# Altium footprint library ICL_passives_v1.PcbLib: 102 footprints (part 1 of 7)
Each footprint in its own frame and in the unit in brackets; x right, y up, seen from the top. Pads: shape width x height; smd on the part's side, far side on the other; paste and mask are expansions set on the pad; w line width, h text height; cw(c..) or ccw(c..) is an arc to the next point about the centre after c.
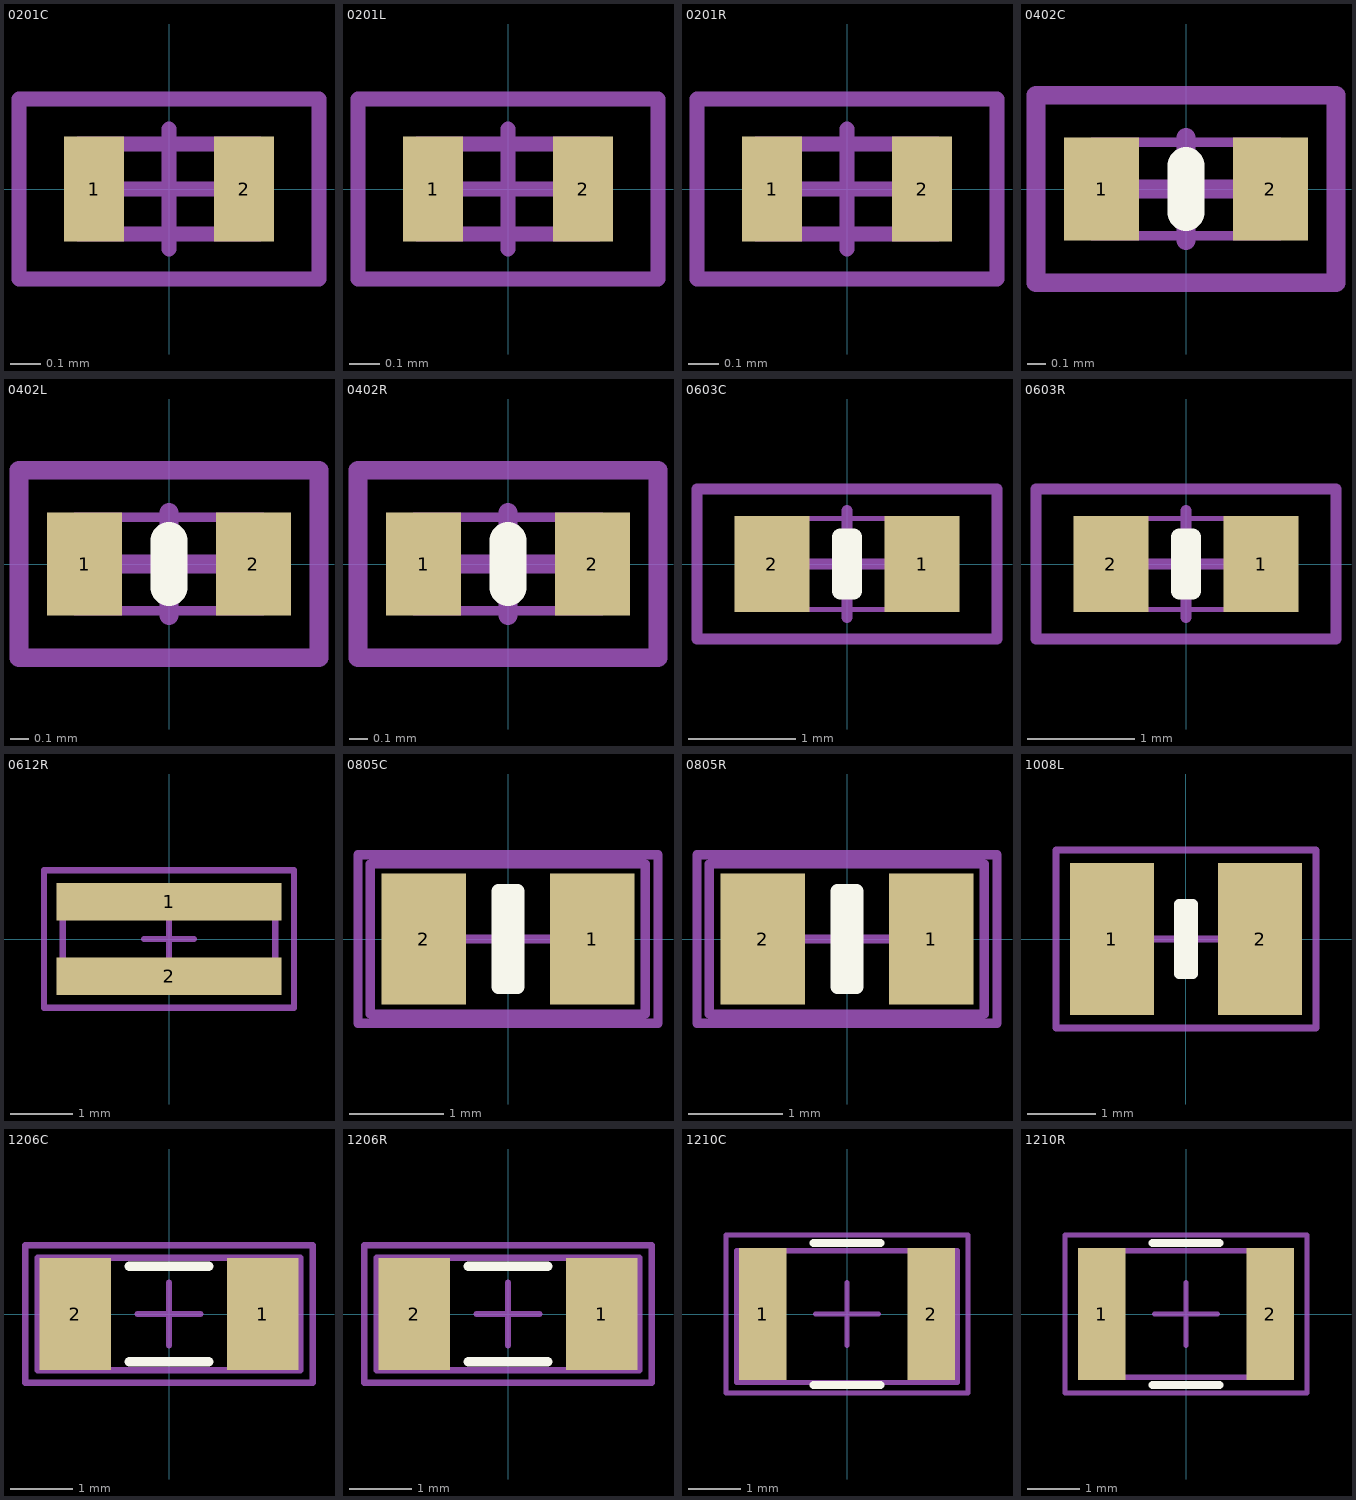
[diagram p0: the footprints below, top view; thin cyan lines are the x and y axes]

## 0201C [mm]
height 0.37
pads (2):
  rect 0.2x0.35 smd mask+0.05: 1(-0.25,0) 2(0.25,0)
Top M11-12_SMOT:
  rectangle: -0.3,-0.15 -0.2,0.15
  rectangle: 0.2,-0.15 0.3,0.15
  lines w0.05: -0.3,-0.15 0.3,-0.15 0.3,0.15 -0.3,0.15 -0.3,-0.15
Top M13-14_SDES:
  text "'.Designator'" at -1.699,-0.125 h0.3
Top M15-16_SORG:
  lines w0.05: -0.275,0 0.275,0 ; 0,-0.2 0,0.2 ; -0.5,-0.3 0.5,-0.3 0.5,0.3 -0.5,0.3 -0.5,-0.3
3D body "0201(0603M) Cap.step": height 0.32, standoff 0.01, extent -0.305,-0.152 0.305,0.152

## 0201L [mm]
height 0.37
pads (2):
  rect 0.2x0.35 smd mask+0.05: 1(-0.25,0) 2(0.25,0)
Top M11-12_SMOT:
  rectangle: -0.3,-0.15 -0.2,0.15
  rectangle: 0.2,-0.15 0.3,0.15
  lines w0.05: -0.3,-0.15 0.3,-0.15 0.3,0.15 -0.3,0.15 -0.3,-0.15
Top M13-14_SDES:
  text "'.Designator'" at -1.699,-0.125 h0.3
Top M15-16_SORG:
  lines w0.05: -0.275,0 0.275,0 ; 0,-0.2 0,0.2 ; -0.5,-0.3 -0.5,0.3 0.5,0.3 0.5,-0.3 -0.5,-0.3
3D body "0201(0603M) Res.step": height 0.32, standoff 0.01, extent -0.305,-0.152 0.305,0.152

## 0201R [mm]
height 0.37
pads (2):
  rect 0.2x0.35 smd mask+0.05: 1(-0.25,0) 2(0.25,0)
Top M11-12_SMOT:
  rectangle: 0.2,-0.15 0.3,0.15
  rectangle: -0.3,-0.15 -0.2,0.15
  lines w0.05: -0.3,-0.15 -0.3,0.15 0.3,0.15 0.3,-0.15 -0.3,-0.15
Top M13-14_SDES:
  text "'.Designator'" at -1.699,-0.125 h0.3
Top M15-16_SORG:
  lines w0.05: -0.275,0 0.275,0 ; 0,-0.2 0,0.2 ; -0.5,-0.3 0.5,-0.3 0.5,0.3 -0.5,0.3 -0.5,-0.3
3D body "0201(0603M) Res.step": height 0.32, standoff 0.01, extent -0.305,-0.152 0.305,0.152

## 0402C [mm]
height 0.37
pads (2):
  rect 0.4x0.55 smd: 1(-0.45,0) 2(0.45,0)
Top Overlay:
  lines w0.2: 0,-0.125 0,0.125
Top M11-12_SMOT:
  rectangle: 0.4,-0.25 0.5,0.25
  rectangle: -0.5,-0.25 -0.4,0.25
  lines w0.05: -0.5,-0.25 0.5,-0.25 0.5,0.25 -0.5,0.25 -0.5,-0.25
Top M13-14_SDES:
  text "'.Designator'" at -2.266,-0.167 h0.4
Top M15-16_SORG:
  lines w0.1: -0.275,0 0.275,0 ; 0,-0.275 0,0.275 ; -0.8,-0.5 -0.8,0.5 0.8,0.5 0.8,-0.5 -0.8,-0.5
3D body "0402(1005M)_C.step": height 0.52, standoff 0.01, extent -0.514,-0.254 0.502,0.254

## 0402L [mm]
height 0.37
pads (2):
  rect 0.4x0.55 smd: 1(-0.45,0) 2(0.45,0)
Top Overlay:
  lines w0.2: 0,-0.125 0,0.125
Top M11-12_SMOT:
  rectangle: -0.5,-0.25 -0.4,0.25
  rectangle: 0.4,-0.25 0.5,0.25
  lines w0.05: -0.5,-0.25 -0.5,0.25 0.5,0.25 0.5,-0.25 -0.5,-0.25
Top M13-14_SDES:
  text "'.Designator'" at -2.266,-0.167 h0.4
Top M15-16_SORG:
  lines w0.1: -0.275,0 0.275,0 ; 0,-0.275 0,0.275 ; -0.8,-0.5 0.8,-0.5 0.8,0.5 -0.8,0.5 -0.8,-0.5
3D body "0402(1005M)R.step": height 0.52, standoff 0.01, extent -0.514,-0.254 0.502,0.254

## 0402R [mm]
height 0.37
pads (2):
  rect 0.4x0.55 smd: 1(-0.45,0) 2(0.45,0)
Top Overlay:
  lines w0.2: 0,-0.125 0,0.125
Top M11-12_SMOT:
  rectangle: -0.5,-0.25 -0.4,0.25
  rectangle: 0.4,-0.25 0.5,0.25
  lines w0.05: -0.5,-0.25 -0.5,0.25 0.5,0.25 0.5,-0.25 -0.5,-0.25
Top M13-14_SDES:
  text "'.Designator'" at -2.266,-0.167 h0.4
Top M15-16_SORG:
  lines w0.1: -0.275,0 0.275,0 ; 0,-0.275 0,0.275 ; -0.8,-0.5 -0.8,0.5 0.8,0.5 0.8,-0.5 -0.8,-0.5
3D body "0402(1005M)R.step": height 0.52, standoff 0.01, extent -0.514,-0.254 0.502,0.254

## 0603C [mm]
height 0.381
pads (2):
  rect 0.7x0.9 smd: 1(0.7,0) 2(-0.7,0)
Top Overlay:
  lines w0.152: -0.064,-0.254 0.064,-0.254 0.064,0.254 -0.064,0.254 -0.064,-0.254
Top M11-12_SMOT:
  rectangle: 0.6,-0.425 0.775,0.425
  rectangle: -0.775,-0.425 -0.6,0.425
  lines w0.05: -0.775,-0.425 0.775,-0.425 0.775,0.425 -0.775,0.425 -0.775,-0.425
Top M13-14_SDES:
  text "'.Designator'" at -3.399,-0.25 h0.6
Top M15-16_SORG:
  lines w0.1: -0.5,0 0.5,0 ; 0,-0.5 0,0.5 ; -1.4,-0.7 -1.4,0.7 1.4,0.7 1.4,-0.7 -1.4,-0.7
3D body "0603(1608M) Cap.step": height 0.79, standoff 0, extent -1,-0.394 1,0.394

## 0603R [mm]
height 0.381
pads (2):
  rect 0.7x0.9 smd: 1(0.7,0) 2(-0.7,0)
Top Overlay:
  lines w0.152: -0.064,-0.254 0.064,-0.254 0.064,0.254 -0.064,0.254 -0.064,-0.254
Top M11-12_SMOT:
  rectangle: 0.6,-0.425 0.775,0.425
  rectangle: -0.775,-0.425 -0.6,0.425
  lines w0.05: -0.775,-0.425 0.775,-0.425 0.775,0.425 -0.775,0.425 -0.775,-0.425
Top M13-14_SDES:
  text "'.Designator'" at -3.399,-0.25 h0.6
Top M15-16_SORG:
  lines w0.1: -0.5,0 0.5,0 ; 0,-0.5 0,0.5 ; -1.4,-0.7 -1.4,0.7 1.4,0.7 1.4,-0.7 -1.4,-0.7
3D body "User Library-0603(1608M) Res.step": height 0.8, standoff 0.01, extent -1,-0.394 1,0.394

## 0612R [mm]
pads (2):
  rect 3.6x0.6 smd: 1(0,0.6) 2(0,-0.6)
Top M11-12_SMOT:
  rectangle: -1.7,0.3 1.7,0.8
  rectangle: -1.7,-0.8 1.7,-0.3
  lines w0.1: -1.7,-0.8 1.7,-0.8 1.7,0.8 -1.7,0.8 -1.7,-0.8
Top M13-14_SDES:
  text "'.Designator'" at -3.399,-0.25 h0.6
Top M15-16_SORG:
  lines w0.1: -0.4,0 0.4,0 ; 0,-0.4 0,0.4 ; -2,-1.1 -2,1.1 2,1.1 2,-1.1 -2,-1.1
3D body "R0612__ERJB2.step": height 0.66, standoff 0.01, extent -1.6,-0.8 1.6,0.8

## 0805C [mm]
pads (2):
  rect 0.9x1.4 smd: 1(0.9,0) 2(-0.9,0)
Top Overlay:
  rectangle: -0.127,-0.508 0.127,0.508
  lines w0.152: -0.102,-0.508 -0.102,0.508 0.102,0.508 0.102,-0.508 -0.102,-0.508
Top M11-12_SMOT:
  lines w0.1: -1.468,-0.8 1.465,-0.8 1.465,0.8 -1.468,0.8 -1.468,-0.8
Top M13-14_SDES:
  text "'.Designator'" at -3.418,-0.218 h0.6
Top M15-16_SORG:
  lines w0.1: -0.5,0 0.5,0 ; 0,-0.5 0,0.5 ; -1.6,-0.9 -1.6,0.9 1.6,0.9 1.6,-0.9 -1.6,-0.9
3D body "SMD_0805_Capacitor.step": height 0.79, standoff 0.01, extent -1,-0.625 1,0.625

## 0805R [mm]
pads (2):
  rect 0.9x1.4 smd: 1(0.9,0) 2(-0.9,0)
Top Overlay:
  rectangle: -0.127,-0.508 0.127,0.508
  lines w0.152: -0.102,-0.508 0.102,-0.508 0.102,0.508 -0.102,0.508 -0.102,-0.508
Top M11-12_SMOT:
  lines w0.1: -1.468,-0.8 -1.468,0.8 1.465,0.8 1.465,-0.8 -1.468,-0.8
Top M13-14_SDES:
  text "'.Designator'" at -3.418,-0.25 h0.6
Top M15-16_SORG:
  lines w0.1: -0.5,0 0.5,0 ; 0,-0.5 0,0.5 ; -1.6,-0.9 1.6,-0.9 1.6,0.9 -1.6,0.9 -1.6,-0.9
3D body "User Library-0805(2012M) Res.step": height 0.8, standoff 0.01, extent -1.254,-0.622 1.254,0.622

## 1008L [mm]
pads (2):
  rect 1.23x2.22 smd: 1(-1.085,0) 2(1.085,0)
Top Overlay:
  rectangle: -0.127,-0.508 0.127,0.508
  lines w0.152: -0.102,-0.508 -0.102,0.508 0.102,0.508 0.102,-0.508 -0.102,-0.508
Top M11-12_SMOT:
  lines w0.1: -1.9,-1.3 1.9,-1.3 1.9,1.3 -1.9,1.3 -1.9,-1.3
Top M13-14_SDES:
  text "'.Designator'" at -3.418,-0.25 h0.6
Top M15-16_SORG:
  lines w0.1: -0.5,0 0.5,0 ; 0,-0.5 0,0.5 ; -1.9,-1.3 -1.9,1.3 1.9,1.3 1.9,-1.3 -1.9,-1.3
3D body "1008L.step": height 1.2, standoff 0, extent -1.35,-1.1 1.35,1.1

## 1206C [mm]
pads (2):
  rect 1.15x1.8 smd: 1(1.5,0) 2(-1.5,0)
Top Overlay:
  lines w0.152: -0.635,-0.762 0.635,-0.762 ; -0.635,0.762 0.635,0.762
Top M11-12_SMOT:
  lines w0.1: -2.1,-0.9 2.1,-0.9 2.1,0.9 -2.1,0.9 -2.1,-0.9
Top M13-14_SDES:
  text "'.Designator'" at -3.418,-0.25 h0.6
Top M15-16_SORG:
  lines w0.1: -0.5,0 0.5,0 ; 0,-0.5 0,0.5 ; -2.3,-1.1 2.3,-1.1 2.3,1.1 -2.3,1.1 -2.3,-1.1
3D body "SMD_1206_Capacitor.step": height 0.98, standoff -0.03, extent -1.6,-0.8 1.6,0.8

## 1206R [mm]
pads (2):
  rect 1.15x1.8 smd: 1(1.5,0) 2(-1.5,0)
Top Overlay:
  lines w0.152: -0.635,-0.762 0.635,-0.762 ; -0.635,0.762 0.635,0.762
Top M11-12_SMOT:
  lines w0.1: -2.1,-0.9 -2.1,0.9 2.1,0.9 2.1,-0.9 -2.1,-0.9
Top M13-14_SDES:
  text "'.Designator'" at -3.399,-0.25 h0.6
Top M15-16_SORG:
  lines w0.1: -0.5,0 0.5,0 ; 0,-0.5 0,0.5 ; -2.3,-1.1 -2.3,1.1 2.3,1.1 2.3,-1.1 -2.3,-1.1
3D body "SMD_1206_Resistor.step": height 0.98, standoff -0.03, extent -1.524,-0.813 1.676,0.787

## 1210C [mm]
pads (2):
  rect 0.9x2.5 smd: 1(-1.6,0) 2(1.6,0)
Top Overlay:
  lines w0.152: -0.635,-1.346 0.635,-1.346 ; -0.635,1.346 0.635,1.346
Top M11-12_SMOT:
  lines w0.1: -2.1,-1.3 -2.1,1.2 2.1,1.2 2.1,-1.3 -2.1,-1.3
Top M13-14_SDES:
  text "'.Designator'" at -3.399,-0.25 h0.6
Top M15-16_SORG:
  lines w0.1: -0.6,0 0,0 ; 0,-0.6 0,0 ; 0,0.6 0,0 ; 0.6,0 0,0 ; -2.3,-1.5 -2.3,1.5 2.3,1.5 2.3,-1.5 -2.3,-1.5
3D body "1210C.step": height 1.3, standoff 0, extent -1.651,-1.27 1.549,1.23

## 1210R [mm]
pads (2):
  rect 0.9x2.5 smd: 1(-1.6,0) 2(1.6,0)
Top Overlay:
  lines w0.152: -0.635,-1.346 0.635,-1.346 ; -0.635,1.346 0.635,1.346
Top M11-12_SMOT:
  lines w0.1: -1.9,-1.2 -1.9,1.2 1.9,1.2 1.9,-1.2 -1.9,-1.2
Top M13-14_SDES:
  text "'.Designator'" at -3.399,-0.25 h0.6
Top M15-16_SORG:
  lines w0.1: -0.6,0 0,0 ; 0,-0.6 0,0 ; 0,0.6 0,0 ; 0.6,0 0,0 ; -2.3,-1.5 -2.3,1.5 2.3,1.5 2.3,-1.5 -2.3,-1.5
3D body "SMD_1210_Resistor.STEP": height 0.63, standoff 0, extent -2.1,-1.346 2.1,1.354